# Altium footprint library tsl_Pcblib.PcbLib: 219 footprints (part 6 of 14)
Each footprint in its own frame and in the unit in brackets; x right, y up, seen from the top. Pads: shape width x height; smd on the part's side, far side on the other; paste and mask are expansions set on the pad; w line width, h text height; cw(c..) or ccw(c..) is an arc to the next point about the centre after c.
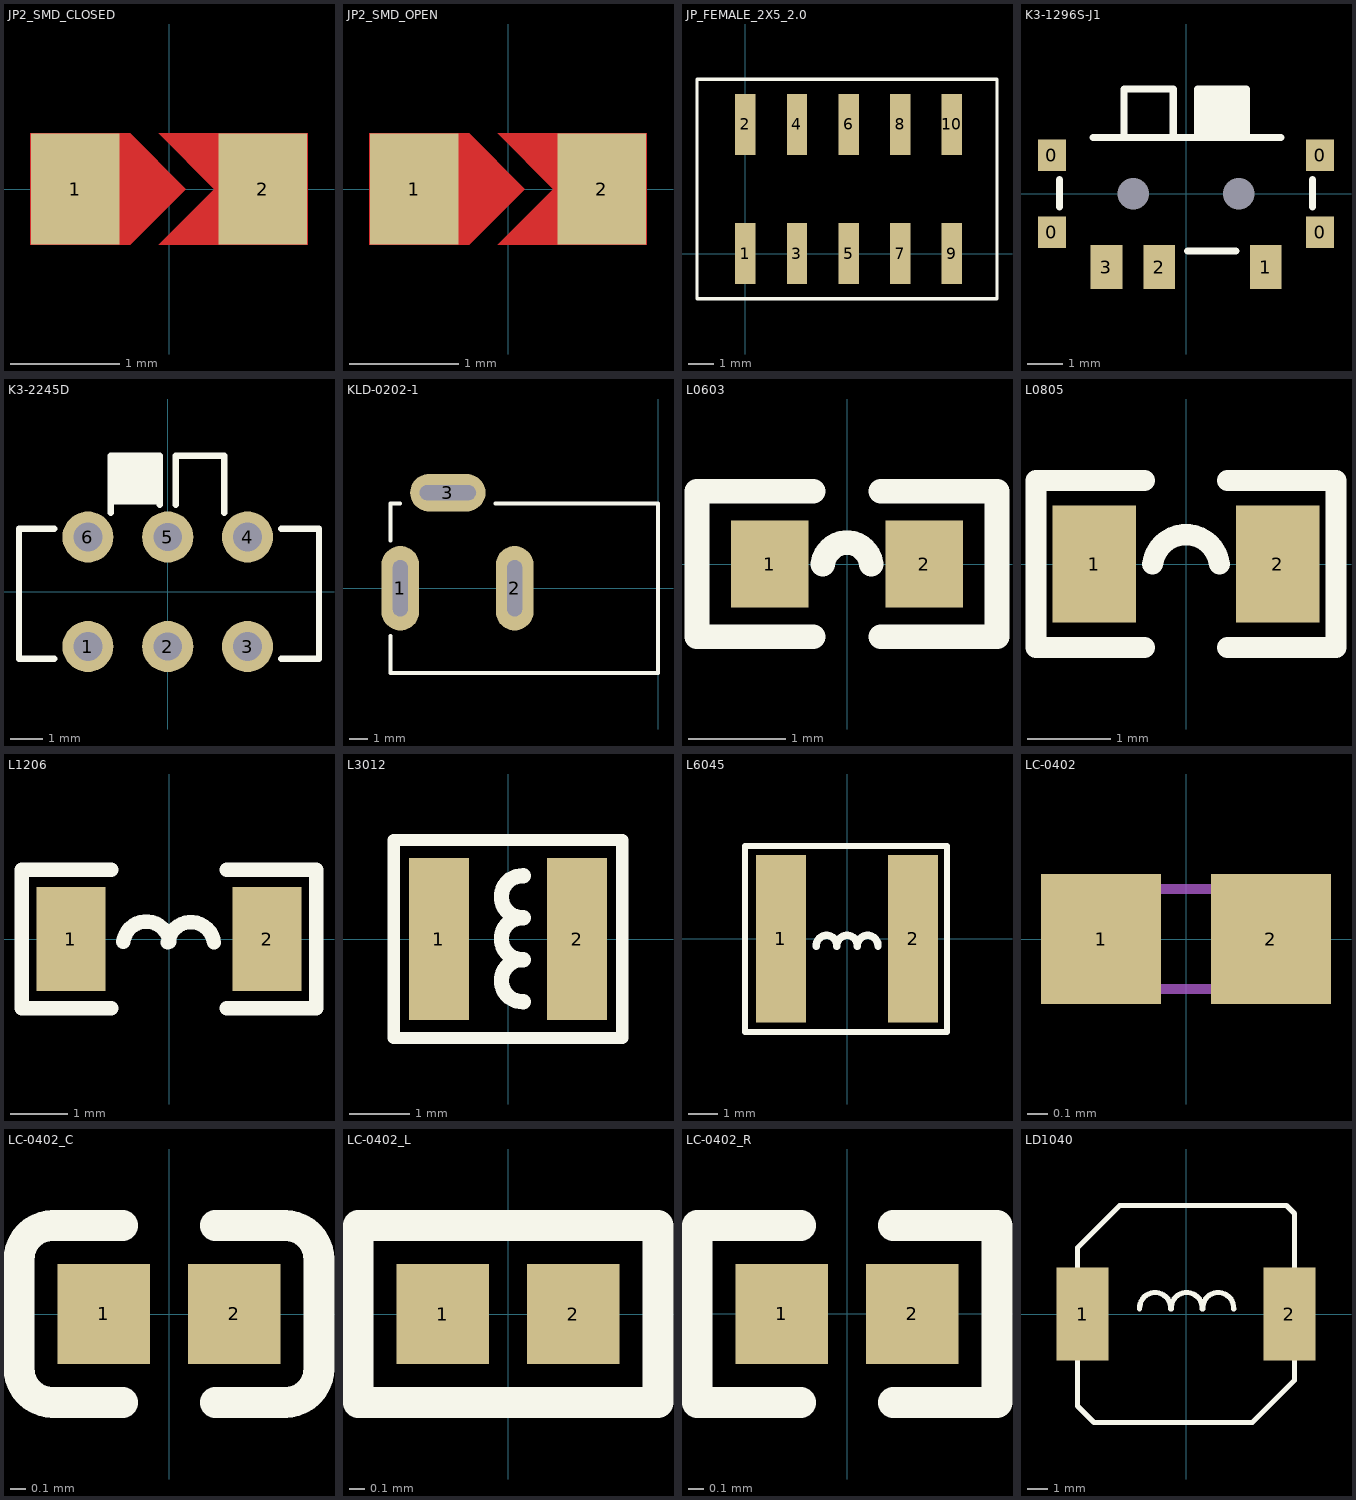
[diagram p5: the footprints below, top view; thin cyan lines are the x and y axes]

## JP2_SMD_CLOSED [mil]
pads (2):
  rect 32x40 smd: 1(-33.75,0) 2(33.75,0)
Top Layer:
  region: -3.75,20 16.25,0 -3.75,-20 50,-20 50,20
  region: -50,-20 -50,20 -14,20 6,0 -14,-20
Top Paste:
  rectangle: -54,-24 54,24
Top Solder:
  rectangle: -54,-24 54,24

## JP2_SMD_OPEN [mil]
pads (2):
  rect 32x40 smd paste-393.7: 1(-33.75,0) 2(33.75,0)
Top Layer:
  region: -50,-20 -50,20 -14,20 6,0 -14,-20
  region: -3.75,20 16.25,0 -3.75,-20 50,-20 50,20
Top Solder:
  rectangle: -54,-24 54,24

## JP_FEMALE_2X5_2.0 [mm]
pads (10):
  rect 0.8x2.4 smd: 1(0,0) 2(0,5.08) 3(2.032,0) 4(2.032,5.08) 5(4.064,0) 6(4.064,5.08) 7(6.096,0) 8(6.096,5.08) 9(8.128,0) 10(8.128,5.08)
Top Overlay:
  lines w0.127: -1.905,-1.778 9.906,-1.778 9.906,6.858 -1.905,6.858 -1.905,-1.778

## K3-1296S-J1 [mm] "7feet switch"
pads (9):
  rect 0.8x0.9 smd: 0(-3.81,-1.092) 0(-3.81,1.092) 0(3.81,-1.092) 0(3.81,1.092)
  rect 0.9x1.25 smd: 1(2.262,-2.083) 2(-0.761,-2.083) 3(-2.259,-2.083)
  round 0 hole 0.9 unplated: 4(-1.5,0) 5(1.5,0)
Top Overlay:
  region: 0.356,2.976 1.72,2.976 1.72,1.6 1.694,1.626 0.323,1.626
  lines w0.203: -3.589,-0.381 -3.589,0.406 ; -2.642,1.6 2.692,1.6 ; -1.76,1.626 -1.76,2.976 -0.363,2.976 -0.363,1.626 ; 0.051,-1.632 1.422,-1.632 ; 0.323,1.626 0.323,2.976 1.72,2.976 1.72,1.6 ; 3.589,-0.381 3.589,0.406

## K3-2245D [mm]
pads (6):
  round 1.6 hole 0.9: 1(-2.5,-1.714) 3(2.5,-1.714) 4(2.5,1.714) 6(-2.5,1.714)
  round 1.6 hole 0.89: 2(0,-1.714) 5(0,1.714)
Top Overlay:
  rectangle: -1.778,2.73 -0.254,4.255
  lines w0.203: -3.556,-2.095 -4.659,-2.095 -4.659,1.968 -3.556,1.968 ; -1.778,2.476 -1.778,4.255 -0.254,4.255 -0.254,2.73 ; 0.254,2.73 0.254,4.255 1.778,4.255 1.778,2.476 ; 3.556,-2.095 4.739,-2.095 4.739,1.968 3.556,1.968

## KLD-0202-1 [mm] "DC Power Jack, 2.5mm, KLD Series, PCB Mount"
pads (3):
  oval 2x4.5 hole 0.8 slot 3 at 90 deg: 1(-13.7,0) 2(-7.62,0)
  oval 4x2 hole 0.8 slot 3 at 0 deg: 3(-11.176,5.08)
Top Overlay:
  lines w0.2: -14.224,-2.54 -14.224,-4.5 0,-4.5 0,4.5 -8.636,4.5 ; -14.224,2.54 -14.224,4.5 -13.716,4.5
3D body "User Library-PJ-002AH.STEP": height 11.05, standoff -3.45, extent -14.326,-4.675 0.074,4.725

## L0603 [mm]
pads (2):
  rect 0.8x0.9 smd: 1(-0.8,0) 2(0.8,0)
Top Overlay:
  lines w0.254: -0.35,-0.75 -1.55,-0.75 -1.55,0.75 -0.35,0.75 ; -0.25,0 cw(c0,-0.032) 0.25,0 ; 0.35,-0.75 1.55,-0.75 1.55,0.75 0.35,0.75
3D body "L0603.STEP": height 0.46, standoff -0.01, extent -0.825,-0.412 0.825,0.413

## L0805 [mm]
pads (2):
  rect 1x1.4 smd: 1(-1.1,0) 2(1.1,0)
Top Overlay:
  lines w0.254: -0.5,-1 -1.8,-1 -1.8,1 -0.5,1 ; -0.4,0 cw(c0,-0.051) 0.4,0 ; 0.5,-1 1.8,-1 1.8,1 0.5,1
3D body "L0805.STEP": height 0.6, standoff -0.02, extent -1.022,-0.637 1.028,0.638

## L1206 [mm]
pads (2):
  rect 1.2x1.8 smd: 1(-1.7,0) 2(1.7,0)
Top Overlay:
  lines w0.25: -1,-1.2 -2.55,-1.2 -2.55,1.2 -1,1.2 ; -0.793,-0.049 cw(c-0.393,-0.1) 0.007,-0.049 ; -0.02,-0.061 cw(c0.38,-0.111) 0.78,-0.061 ; 1,-1.2 2.55,-1.2 2.55,1.2 1,1.2

## L3012 [mm]
pads (2):
  rect 1x2.7 smd: 1(-1.15,0) 2(1.15,0)
Top Overlay:
  lines w0.203: -1.905,-1.651 -1.905,1.651 1.905,1.651 1.905,-1.651 -1.905,-1.651
  lines w0.254: 0.254,-1.044 cw(c0.239,-0.695) 0.254,-0.345 cw(c0.239,0.005) 0.254,0.354 cw(c0.239,0.704) 0.254,1.054

## L6045 [mm]
pads (2):
  rect 1.7x5.7 smd: 1(-2.25,0) 2(2.25,0)
Top Overlay:
  lines w0.203: -3.465,-3.175 -3.465,3.152 3.393,3.152 3.393,-3.175 -3.465,-3.175
  lines w0.254: -1.044,-0.254 cw(c-0.695,-0.239) -0.345,-0.254 cw(c0.005,-0.239) 0.354,-0.254 cw(c0.704,-0.239) 1.054,-0.254

## LC-0402 [mm]
pads (2):
  rect 0.6x0.65 smd mask+0.051: 1(-0.425,0) 2(0.425,0)
Mechanical 13:
  lines w0.05: -0.5,-0.25 0.5,-0.25 0.5,0.25 -0.5,0.25 -0.5,-0.25

## LC-0402_C [mm]
pads (2):
  rect 0.6x0.65 smd mask+0.051: 1(-0.425,0) 2(0.425,0)
Top Overlay:
  lines w0.2: -0.755,-0.575 cw(c-0.755,-0.355) -0.975,-0.355 -0.975,0.355 cw(c-0.755,0.355) -0.755,0.575 ; -0.75,-0.575 -0.3,-0.575 ; -0.75,0.575 -0.3,0.575 ; 0.3,-0.575 0.75,-0.575 ; 0.3,0.575 0.75,0.575 ; 0.755,-0.575 ccw(c0.755,-0.355) 0.975,-0.355 0.975,0.355 ccw(c0.755,0.355) 0.755,0.575
3D body "0402 SMD Capacitor.step": height 0.2, standoff 0, extent -0.483,-0.3 0.518,0.3

## LC-0402_L [mm]
pads (2):
  rect 0.6x0.65 smd mask+0.051: 1(-0.425,0) 2(0.425,0)
Top Overlay:
  lines w0.2: -0.975,-0.575 -0.975,0.575 0.975,0.575 0.975,-0.575 -0.975,-0.575
3D body "L0402.STEP": height 0.36, standoff -0.01, extent -0.512,-0.262 0.538,0.263

## LC-0402_R [mm]
pads (2):
  rect 0.6x0.65 smd mask+0.051: 1(-0.425,0) 2(0.425,0)
Top Overlay:
  lines w0.2: -0.3,-0.575 -0.975,-0.575 -0.975,0.575 -0.3,0.575 ; 0.3,-0.575 0.975,-0.575 0.975,0.575 0.3,0.575
3D body "User Library-RES_1005-0402.STEP": height 0.41, standoff 0, extent -0.575,-0.275 0.575,0.275

## LD1040 [mm]
pads (2):
  rect 2.5x4.5 smd: 1(-5,0) 2(5,0)
Top Overlay:
  lines w0.254: -2.242,0.254 cw(c-1.492,0.287) -0.742,0.254 ; -0.718,0.254 cw(c0.032,0.287) 0.782,0.254 ; 0.806,0.254 cw(c1.556,0.287) 2.306,0.254 ; -5.25,-4.45 -5.25,3.2 -3.2,5.25 4.85,5.25 5.25,4.85 5.25,-3.2 3.2,-5.25 -4.45,-5.25 -5.25,-4.45
3D body "Inductor-User Library-MSS1038.step": height 3.8, standoff -0.01, extent -5.105,-5 5.105,5